# Altium footprint library Binh.PcbLib: 863 footprints (part 34 of 54)
Each footprint in its own frame and in the unit in brackets; x right, y up, seen from the top. Pads: shape width x height; smd on the part's side, far side on the other; paste and mask are expansions set on the pad; w line width, h text height; cw(c..) or ccw(c..) is an arc to the next point about the centre after c.
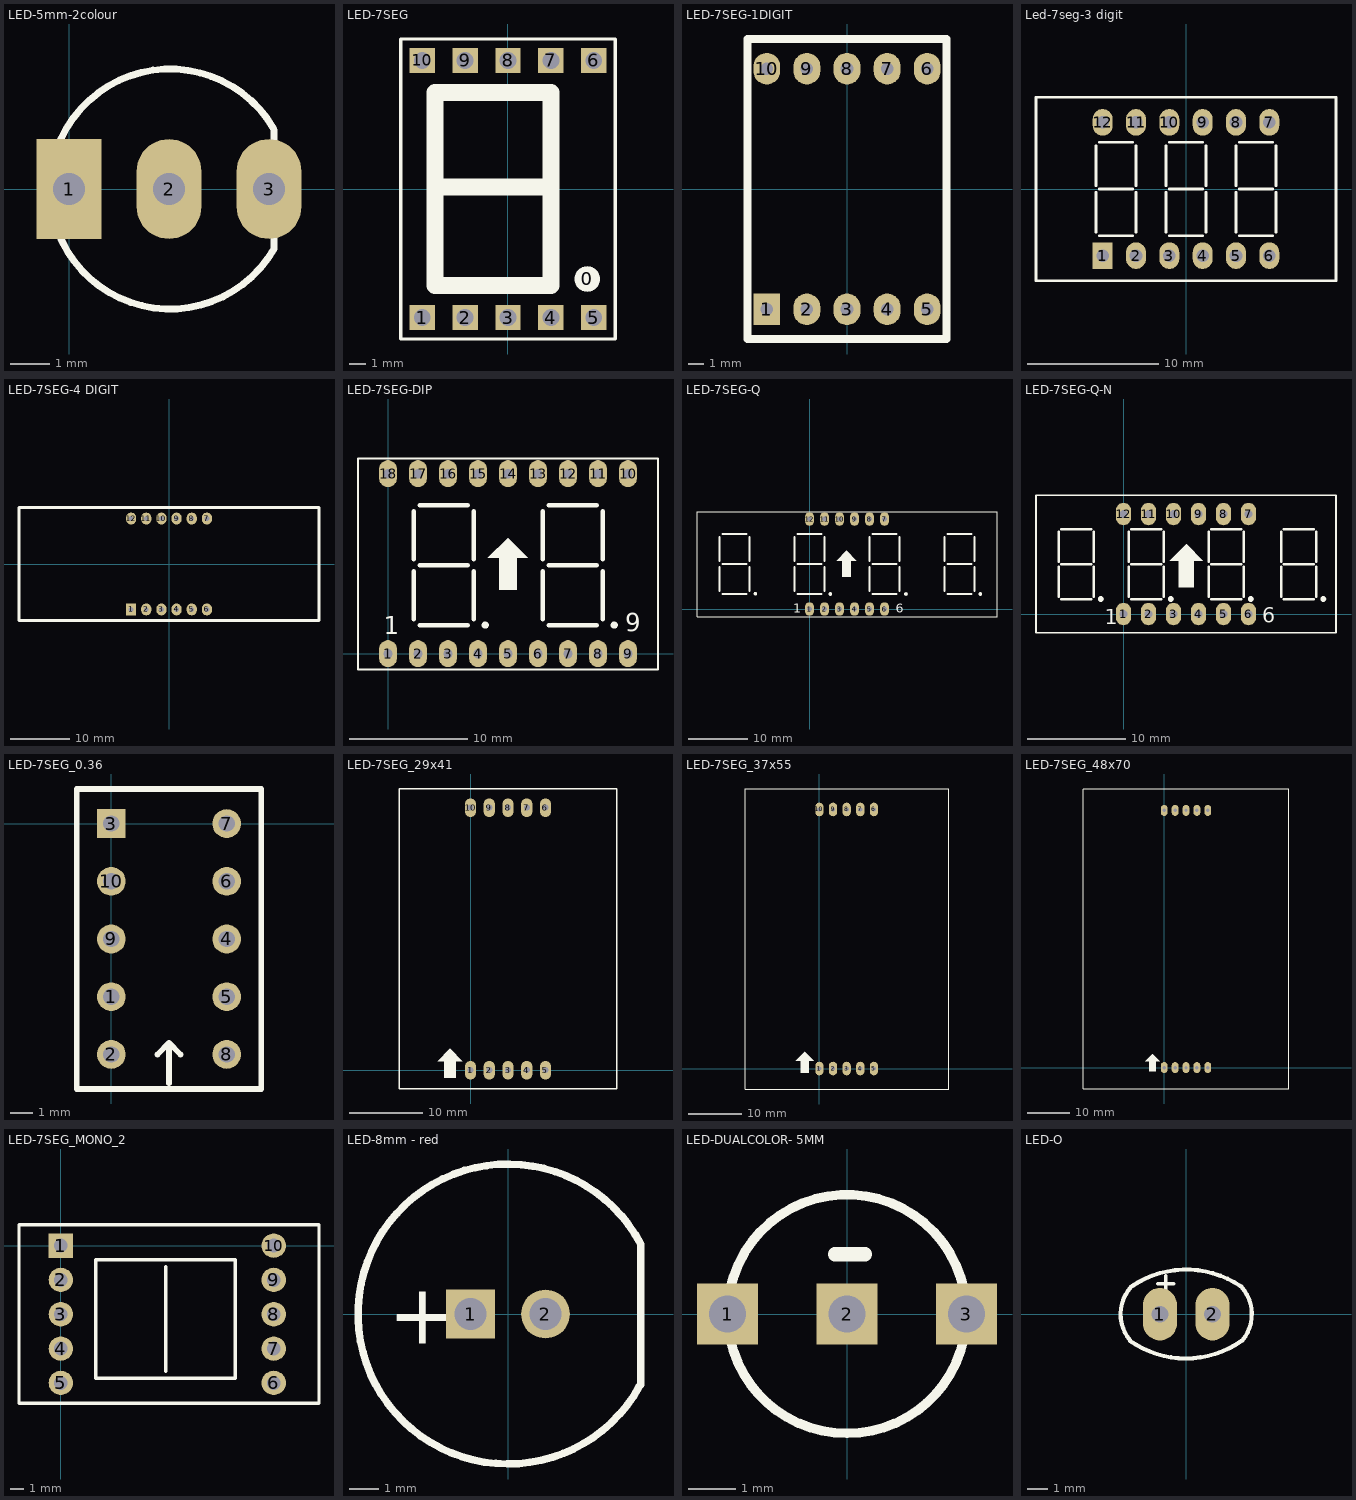
[diagram p33: the footprints below, top view; thin cyan lines are the x and y axes]

## LED-5mm-2colour [mil] "LED 3 PIN, 5 ly , Two colour"
height 300
pads (3):
  rect 65x100 hole 32: 1(0,0)
  oval 65x100 hole 32: 2(100,0) 3(200,0)
Top Overlay:
  lines w7: 204.51,60.71 ccw(c101,0) 204.94,-59.97 ; 205,-59 205,59
3D body "LED-5mmBiColor.STEP": height 457.11, standoff -71.89, extent -13,-116.96 213,115

## LED-7SEG [mm] "LED7SEG"
pads (11):
  round 1.524 on Top Overlay: 0(4.724,-5.334)
  rect 1.5x1.5 hole 1: 1(-5.055,-7.62) 2(-2.515,-7.62) 3(0.025,-7.62) 4(2.565,-7.62) 5(5.105,-7.62) 6(5.105,7.62) 7(2.565,7.62) 8(0.025,7.62) 9(-2.515,7.62) 10(-5.055,7.62)
Top Overlay:
  lines w0.2: -6.325,-8.89 -6.325,8.89 6.375,8.89 6.375,-8.89 -6.325,-8.89
  lines w1: -4.166,0.127 2.565,0.127 ; -4.293,-5.715 2.565,-5.715 2.565,5.715 -4.293,5.715 -4.293,-5.715
3D body "SW3DPS-7SEGMENT DISPLAY.STEP": height 8.03, standoff -3.97, extent -6.35,-9.525 6.35,9.525

## LED-7SEG-1DIGIT [mm] "LED 7SEG 1DIGIT"
height 7.62
pads (10):
  rect 1.7x2 hole 0.8: 1(-5.08,-7.62)
  oval 1.7x2 hole 0.8: 2(-2.54,-7.62) 3(0,-7.62) 4(2.54,-7.62) 5(5.08,-7.62) 6(5.08,7.62) 7(2.54,7.62) 8(0,7.62) 9(-2.54,7.62) 10(-5.08,7.62)
Top Overlay:
  lines w0.5: -6.3,-9.5 6.3,-9.5 6.3,9.5 -6.3,9.5 -6.3,-9.5
3D body: height 8, standoff 0, extent -6.325,-9.576 6.274,9.423

## Led-7seg-3 digit [mil] "DIP; 14 Leads (2 Absent); Row Spacing 7.62 mm; Pitch 2.54 mm"
height 165.35
pads (12):
  rect 60x80 hole 38: 1(-250,-200)
  oval 60x80 hole 38: 2(-150,-200) 3(-50,-200) 4(50,-200) 5(150,-200) 6(250,-200) 7(250,200) 8(150,200) 9(50,200) 10(-50,200) 11(-150,200) 12(-250,200)
Top Overlay:
  lines w8: -270,-130 -270,-10 ; -270,10 -270,130 ; -260,-140 -160,-140 ; -260,0 -160,0 ; -260,140 -160,140 ; -150,-130 -150,-10 ; -150,10 -150,130 ; -60,-130 -60,-10 ; -60,10 -60,130 ; -50,-140 50,-140 ; -50,0 50,0 ; -50,140 50,140 ; 60,-130 60,-10 ; 60,10 60,130 ; 150,-130 150,-10 ; 150,10 150,130 ; 160,-140 260,-140 ; 160,0 260,0 ; 160,140 260,140 ; 270,-130 270,-10 ; 270,10 270,130 ; -450,-275 450,-275 450,275 -450,275 -450,-275

## LED-7SEG-4 DIGIT [mm] "LED 7SEG 4DIGIT"
height 7.62
pads (12):
  rect 1.7x2 hole 0.8: 1(-6.35,-7.62)
  oval 1.7x2 hole 0.8: 2(-3.81,-7.62) 3(-1.27,-7.62) 4(1.27,-7.62) 5(3.81,-7.62) 6(6.35,-7.62) 7(6.35,7.62) 8(3.81,7.62) 9(1.27,7.62) 10(-1.27,7.62) 11(-3.81,7.62) 12(-6.35,7.62)
Top Overlay:
  lines w0.5: -25.15,-9.5 25.15,-9.5 25.15,9.5 -25.15,9.5 -25.15,-9.5
3D body: height 8, standoff 0, extent -25.121,-9.5 25.121,9.474

## LED-7SEG-DIP [mil] "DIP 18 Leads; Body 24 x 15 mm; Pitch 0.5 mm"
height 300
pads (18):
  oval 60x90 hole 31 paste+0: 1(0,0) 2(100,0) 3(200,0) 5(400,0) 6(500,0) 7(600,0) 8(700,0) 9(800,0) 10(800,600) 11(700,600) 12(600,600) 13(500,600) 14(400,600) 15(300,600) 16(200,600) 17(100,600) 18(0,600)
  oval 60x90 hole 31: 4(300,0)
Top Overlay:
  circle w12: c324,95 r6
  circle w12: c754,95 r6
  region: 333,319 399,385 401,385 466,320 466,319 429,319 429,213 370,213 370,319
  lines w7: -100,-52.5 -100,650 ; -100,-52.5 -100,650 ; -100,-52.5 -100,650 ; -100,-52.5 -100,650 ; -100,650 900,650 ; -100,650 900,650 ; -100,650 900,650 ; -100,650 900,650 ; 900,-52.5 900,650 ; 900,-52.5 900,650 ; 900,-52.5 -100,-52 900,-52.5 ; 900,-52.5 900,650 ; 900,-52.5 900,650
  lines w15: 85,115 85,275 ; 85,115 85,275 ; 85,115 85,275 ; 85,115 85,275 ; 85,115 85,275 ; 85,115 85,275 ; 85,115 85,275 ; 85,115 85,275 ; 85,315 85,475 ; 85,315 85,475 ; 85,315 85,475 ; 85,315 85,475 ; 85,315 85,475 ; 85,315 85,475 ; 85,315 85,475 ; 85,315 85,475 ; 105,95 265,95 ; 105,95 265,95 ; 105,95 265,95 ; 105,95 265,95 ; 105,295 265,295 ; 105,295 265,295 ; 105,295 265,295 ; 105,295 265,295 ; 105,295 265,295 ; 105,295 265,295 ; 105,295 265,295 ; 105,295 265,295 ; 105,495 265,495 ; 105,495 265,495 ; 105,495 265,495 ; 105,495 265,495 ; 285,115 285,275 ; 285,115 285,275 ; 285,115 285,275 ; 285,115 285,275 ; 285,115 285,275 ; 285,115 285,275 ; 285,115 285,275 ; 285,115 285,275 ; 285,315 285,475 ; 285,315 285,475 ; 285,315 285,475 ; 285,315 285,475 ; 285,315 285,475 ; 285,315 285,475 ; 285,315 285,475 ; 285,315 285,475 ; 515,115 515,275 ; 515,115 515,275 ; 515,115 515,275 ; 515,115 515,275 ; 515,115 515,275 ; 515,115 515,275 ; 515,115 515,275 ; 515,115 515,275 ; 515,315 515,475 ; 515,315 515,475 ; 515,315 515,475 ; 515,315 515,475 ; 515,315 515,475 ; 515,315 515,475 ; 515,315 515,475 ; 515,315 515,475 ; 535,95 695,95 ; 535,95 695,95 ; 535,95 695,95 ; 535,95 695,95 ; 535,295 695,295 ; 535,295 695,295 ; 535,295 695,295 ; 535,295 695,295 ; 535,295 695,295 ; 535,295 695,295 ; 535,295 695,295 ; 535,295 695,295 ; 535,495 695,495 ; 535,495 695,495 ; 535,495 695,495 ; 535,495 695,495 ; 715,115 715,275 ; 715,115 715,275 ; 715,115 715,275 ; 715,115 715,275 ; 715,115 715,275 ; 715,115 715,275 ; 715,115 715,275 ; 715,115 715,275 ; 715,315 715,475 ; 715,315 715,475 ; 715,315 715,475 ; 715,315 715,475 ; 715,315 715,475 ; 715,315 715,475 ; 715,315 715,475 ; 715,315 715,475
  text "9" at 790,75 h60
  text "1" at -14,65 h60

## LED-7SEG-Q [mil] "DIP 12 Leads; Body 48 x 20 mm; Pitch 0.5 mm"
height 300
pads (12):
  oval 60x90 hole 31: 1(0,0) 2(100,0) 3(200,0) 4(300,0) 5(400,0) 6(500,0) 7(500,600) 8(400,600) 9(300,600) 10(200,600) 11(100,600) 12(0,600)
Top Overlay:
  drawing of 155 lines, arcs and shapes, not listed
  text "1" at -108,-24 h60
  text "6" at 575,-26 h60

## LED-7SEG-Q-N [mil] "DIP 12 Leads; Body 32x 15 mm; Pitch 0.5 mm"
height 300
pads (12):
  oval 60x90 hole 31: 1(0,0) 2(100,0) 3(200,0) 4(300,0) 5(400,0) 6(500,0) 7(500,400) 8(400,400) 9(300,400) 10(200,400) 11(100,400) 12(0,400)
Top Overlay:
  circle w12: c189,60 r6
  circle w12: c-91,60 r6
  circle w12: c799,60 r6
  circle w12: c509,60 r6
  region: 184,213 250,279 252,279 317,214 317,213 280,213 280,107 221,107 221,213
  lines w7: -350,-75 850,-75 850,475 -350,475 -350,-75
  lines w10: -260,70 -260,190 ; -260,210 -260,330 ; -250,60 -130,60 ; -250,340 -130,340 ; -120,70 -120,190 ; -120,210 -120,330 ; 20,70 20,190 ; 20,210 20,330 ; 30,60 150,60 ; 30,340 150,340 ; 160,70 160,190 ; 160,210 160,330 ; 340,70 340,190 ; 340,210 340,330 ; 350,60 470,60 ; 350,340 470,340 ; 480,70 480,190 ; 480,210 480,330 ; 630,70 630,190 ; 630,210 630,330 ; 640,60 760,60 ; 640,340 760,340 ; 770,70 770,190 ; 770,210 770,330 ; -250,200 -130,200 -250,200 ; 30,200 150,200 30,200 ; 350,200 470,200 350,200 ; 640,200 760,200 640,200
  text "6" at 555,-35 h60
  text "1" at -75,-40 h60
3D body "SW3dPS-LTC-3710HR DISPLAY, 4-LED.STEP": height 238, standoff -98, extent -335.5,-70 865.5,450

## LED-7SEG_0.36 [mil] "led 7 - 0.36 - 10 pin"
height 314.96
pads (10):
  round 50 hole 28: 1(0,-300) 2(0,-400) 4(200,-200) 5(200,-300) 6(200,-100) 7(200,0) 8(200,-400) 9(0,-200) 10(0,-100)
  rect 50x50 hole 28: 3(0,0)
Top Overlay:
  lines w10: 80,-400 100,-380 ; 100,-450 100,-380 ; 120,-400 100,-380 ; -60,-460 260,-460 260,60 -60,60 -60,-460

## LED-7SEG_29x41 [mil] "DIP 10 Leads; Body 29 x 41 mm; Pitch 0.5 mm"
height 300
pads (10):
  oval 60x100 hole 32: 1(0,0) 2(100,0) 3(200,0) 4(300,0) 5(400,0) 6(400,1400) 7(300,1400) 8(200,1400) 9(100,1400) 10(0,1400)
Top Overlay:
  region: -176,48 -110,114 -108,114 -43,49 -43,48 -80,48 -80,-40 -139,-40 -139,48
  lines w7: -380,-100 780,-100 780,1500 -380,1500 -380,-100

## LED-7SEG_37x55 [mil] "DIP 10 Leads; Body 29 x 41 mm; Pitch 0.5 mm"
height 300
pads (10):
  oval 60x100 hole 32: 1(0,0) 2(100,0) 3(200,0) 4(300,0) 5(400,0) 6(400,1900) 7(300,1900) 8(200,1900) 9(100,1900) 10(0,1900)
Top Overlay:
  region: -174,56 -108,122 -106,122 -41,57 -41,56 -78,56 -78,-32 -137,-32 -137,56
  lines w7: -545,-150 950,-150 950,2050 -545,2050 -545,-150

## LED-7SEG_48x70 [mm] "DIP 10 Leads; Body 47,76 x 70mm; Pitch 0.5 mm"
height 7.62
pads (10):
  oval 1.6x2.54 hole 0.813: 1(0,0) 2(2.54,0) 3(5.08,0) 4(7.62,0) 5(10.16,0) 6(10.16,60) 7(7.62,60) 8(5.08,60) 9(2.54,60) 10(0,60)
Top Overlay:
  region: -4.42,1.422 -2.743,3.099 -2.692,3.099 -1.041,1.448 -1.041,1.422 -1.981,1.422 -1.981,-0.813 -3.48,-0.813 -3.48,1.422
  lines w0.178: -18.92,65 29.08,65 ; -18.92,-5 29.08,-5 -18.92,-5
  lines w0.203: -18.923,-4.928 -18.923,64.999 ; 29.058,-4.928 29.058,64.999

## LED-7SEG_MONO_2 [mm]
pads (10):
  rect 1.778x1.778 hole 1 unplated: 1(0,0)
  round 1.778 hole 1 unplated: 2(0,-2.5) 3(0,-5) 4(0,-7.5) 5(0,-10) 6(15.5,-10) 7(15.5,-7.5) 8(15.5,-5) 9(15.5,-2.5) 10(15.5,0)
Top Overlay:
  lines w0.2: -3.048,-11.484 -3.048,1.016 ; 18.796,-11.484 18.796,1.016
  lines w0.254: -3.048,-11.484 18.796,-11.484 ; -3.048,1.016 -3.048,1.524 18.796,1.524 18.796,1.016 ; 7.62,-9.144 7.62,-8.636 7.62,-1.524 ; 2.54,-9.652 2.54,-1.016 12.7,-1.016 12.7,-9.652 2.54,-9.652

## LED-8mm - red [mil] "LED phi 8mm"
height 649.61
pads (2):
  rect 65x65 hole 43.31: 1(-50,0)
  round 65 hole 43.31: 2(50,0)
Top Overlay:
  lines w10: 175.24,-96.38 cw(c0,0) 176.98,93.15 176.98,-94.64
  text "+" at -160,-40 h80
3D body "LED-D8R.STEP": height 551.18, standoff -1102.36, extent -177.16,-177.16 158.66,177.16

## LED-DUALCOLOR- 5MM [mil]
pads (3):
  rect 51.17x51.17 / inner rect 52x52 / far side rect 51.17x51.17 hole 31: 1(-100,0)
  rect 51.17x51.17 / inner round 52 / far side rect 51.17x51.17 hole 31: 2(0,0) 3(100,0)
Top Overlay:
  lines w8: 80.64,59.14 cw(c0,0) 100,0 ; 100,0 ccw(c0,0) -100,0 ccw(c0,0) 0,-100 ccw(c0,0) 100,0
  lines w11.82: -10,50 15,50

## LED-O [mil] "LED 2 PIN,  Ovan Only colour, pin to pin 110mil"
height 300
pads (2):
  oval 65x100 hole 32: 1(-50,0) 2(50,0)
Top Overlay:
  lines w7: -54,58 -24,58 ; -39,43 -39,73
  lines w8: -106.82,-49.85 cw(c-47,0) -104.5,52.5 ; -106.38,-51.11 ccw(c-0.81,100.81) 104.97,-50.96 ; -102.83,53.79 cw(c0,-100) 103.93,53.04 ; 104.5,52.5 cw(c47,0) 106.82,-49.85